# Altium footprint library 示波器.PcbLib: 26 footprints (part 2 of 2)
Each footprint in its own frame and in the unit in brackets; x right, y up, seen from the top. Pads: shape width x height; smd on the part's side, far side on the other; paste and mask are expansions set on the pad; w line width, h text height; cw(c..) or ccw(c..) is an arc to the next point about the centre after c.
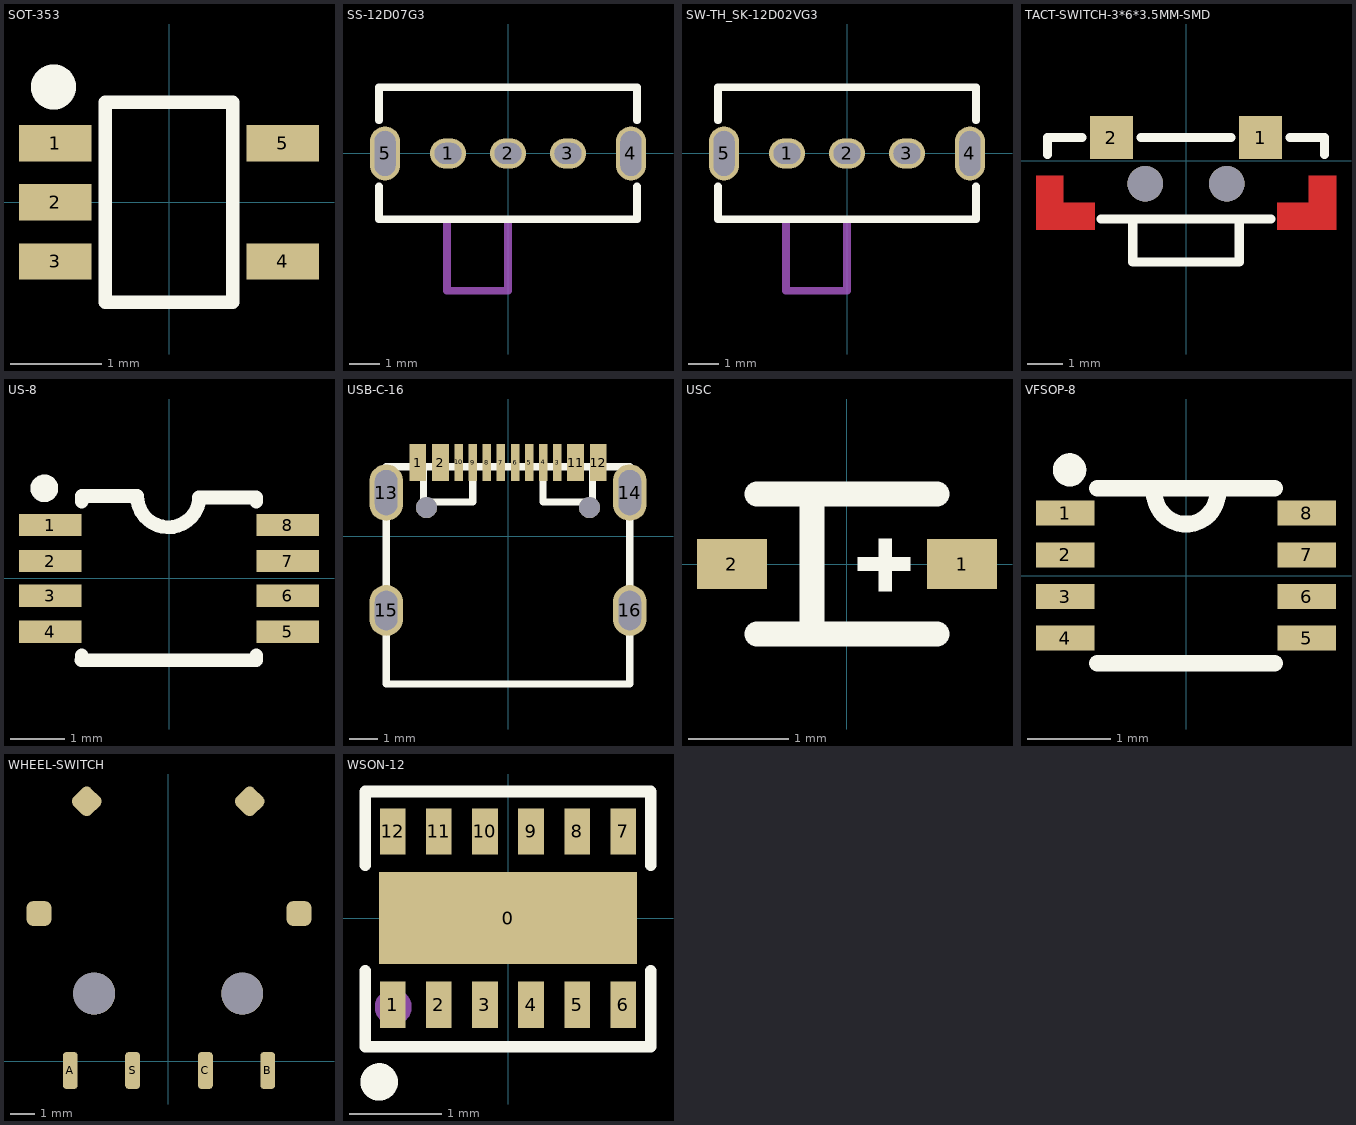
[diagram p1: the footprints below, top view; thin cyan lines are the x and y axes]

## SOT-353 [mm]
pads (5):
  rect 0.8x0.4 smd: 1(-1.25,0.65) 2(-1.25,0) 3(-1.25,-0.65) 4(1.25,-0.65) 5(1.25,0.65)
Top Overlay:
  lines w0.15: -0.7,-1.1 -0.7,1.1 0.7,1.1 0.7,-1.1 -0.7,-1.1
  lines w0.249: -1.394,1.269 ccw(c-1.27,1.27) -1.394,1.271
3D body "User Library-SOT353-1.step": height 1.1, standoff 0, extent -1.2,-1.1 1.2,1.1

## SS-12D07G3 [mm]
pads (5):
  oval 1.2x1 hole 0.7 slot 0.9 at 0 deg: 1(-2,0) 2(0,0) 3(2,0)
  oval 1x1.8 hole 0.7 slot 1.5 at 90 deg: 4(4.1,0) 5(-4.1,0)
Top Overlay:
  lines w0.254: -4.3,-1.103 -4.3,-2.2 4.3,-2.2 4.3,-1.103 ; -4.3,1.103 -4.3,2.2 4.3,2.2 4.3,1.103
Mechanical 15:
  lines w0.254: -2.032,-2.286 -2.032,-4.572 0,-4.572 0,-2.286

## SW-TH_SK-12D02VG3 [mm]
pads (5):
  oval 1.2x1 hole 0.7 slot 0.9 at 0 deg: 1(-2,0) 2(0,0) 3(2,0)
  oval 1x1.8 hole 0.7 slot 1.5 at 90 deg: 4(4.1,0) 5(-4.1,0)
Top Overlay:
  lines w0.254: -4.3,-1.103 -4.3,-2.2 4.3,-2.2 4.3,-1.103 ; -4.3,1.103 -4.3,2.2 4.3,2.2 4.3,1.103
Mechanical 15:
  lines w0.254: -2.032,-2.286 -2.032,-4.572 0,-4.572 0,-2.286

## TACT-SWITCH-3*6*3.5MM-SMD [mm]
pads (4):
  rect 1.2x1.2 smd: 1(2.1,0.65) 2(-2.1,0.65)
  round 1 hole 1 unplated: ""(-1.15,-0.65) ""(1.15,-0.65)
Top Layer:
  region: -4.226,-0.426 -3.464,-0.426 -3.464,-1.188 -2.575,-1.188 -2.575,-1.95 -4.226,-1.95
  region: 4.226,-0.426 3.464,-0.426 3.464,-1.188 2.575,-1.188 2.575,-1.95 4.226,-1.95
Top Overlay:
  lines w0.254: -3.9,0.171 -3.9,0.65 -2.931,0.65 ; -2.4,-1.65 2.4,-1.65 ; -1.5,-1.65 -1.5,-2.85 1.5,-2.85 1.5,-1.65 ; -1.269,0.65 1.269,0.65 ; 2.931,0.65 3.9,0.65 3.9,0.171
Top Paste:
  region: -4.226,-0.426 -3.464,-0.426 -3.464,-1.188 -2.575,-1.188 -2.575,-1.95 -4.226,-1.95
  region: 4.226,-0.426 3.464,-0.426 3.464,-1.188 2.575,-1.188 2.575,-1.95 4.226,-1.95
Top Solder:
  region: -4.226,-0.426 -3.464,-0.426 -3.464,-1.188 -2.575,-1.188 -2.575,-1.95 -4.226,-1.95
  region: 4.226,-0.426 3.464,-0.426 3.464,-1.188 2.575,-1.188 2.575,-1.95 4.226,-1.95
3D body "User Library-E-Switch - TL3330AF130QG (Tact Switch, SMD).step": height 3.5, standoff 0, extent -3.9,-2.838 3.9,0.762

## US-8 [mm]
pads (8):
  rect 1.15x0.406 smd: 1(-2.175,0.978) 2(-2.175,0.318) 3(-2.175,-0.318) 4(-2.175,-0.978) 5(2.175,-0.978) 6(2.175,-0.318) 7(2.175,0.318) 8(2.175,0.978)
Top Overlay:
  circle w0.254: c-2.286,1.651 r0.127
  lines w0.254: -1.603,-1.501 1.595,-1.501 ; -1.6,-1.501 -1.6,-1.412 ; -1.6,1.412 -1.6,1.511 -0.584,1.511 ccw(c-0.013,1.51) 0.559,1.486 ; 0.549,1.486 1.599,1.486 1.599,1.412 ; 1.599,-1.501 1.599,-1.412
3D body "User Library-DGK(S-PDSO-G8).step": height 1.1, standoff 0, extent -2.557,-1.55 2.525,1.55

## USB-C-16 [mm]
pads (18):
  rect 0.6x1.3 smd: 1(-3.2,2.623) 2(-2.4,2.623) 11(2.4,2.623) 12(3.2,2.623)
  rect 0.3x1.3 smd: 3(1.75,2.623) 4(1.25,2.624) 5(0.75,2.623) 6(0.25,2.623) 7(-0.25,2.623) 8(-0.75,2.623) 9(-1.25,2.623) 10(-1.75,2.624)
  oval 1.2x2 hole 0.8 slot 1.6 at 90 deg: 13(-4.32,1.556) 14(4.32,1.556)
  oval 1.2x1.8 hole 0.8 slot 1.4 at 90 deg: 15(-4.32,-2.624) 16(4.32,-2.624)
  round 0.75 hole 0.75 unplated: ""(-2.89,1.026) ""(2.89,1.026)
Top Overlay:
  lines w0.254: -3,2.471 -3,1.221 -1.25,1.221 -1.25,2.471 ; 1.247,2.473 1.247,1.223 2.997,1.223 2.997,2.473 ; -4.32,-5.227 4.32,-5.227 4.32,2.471 -4.32,2.471 -4.32,-5.227
3D body "USB Type C Port (SMD Type).STEP": height 3.26, standoff -0.94, extent -4.47,-5.268 4.47,2.632

## USC [mm]
pads (2):
  rect 0.7x0.5 smd: 1(1.15,0) 2(-1.15,0)
Top Overlay:
  region: 0.635,-0.066 0.108,-0.066 0.108,0.066 0.635,0.066
  region: 0.315,-0.273 0.315,0.254 0.447,0.254 0.447,-0.273
  lines w0.254: -0.9,-0.7 0.9,-0.7 ; -0.9,0.7 0.9,0.7 ; -0.35,-0.7 -0.35,0.7

## VFSOP-8 [mm]
pads (8):
  rect 0.7x0.3 smd: 1(-1.45,0.75) 2(-1.45,0.25) 3(-1.45,-0.25) 4(-1.45,-0.75) 5(1.45,-0.75) 6(1.45,-0.25) 7(1.45,0.25) 8(1.45,0.75)
Top Overlay:
  circle w0.2: c-1.397,1.27 r0.1
  lines w0.2: -1.064,-1.05 0,-1.05 1.064,-1.05 ; -1.064,1.05 1.064,1.05 ; -0.381,1.016 ccw(c0,1) 0.381,1.016
3D body "User Library-TSSOP50P310X90-8N.STEP": height 0.9, standoff 0, extent -1.549,-1.05 1.549,1.05

## WHEEL-SWITCH [mm]
pads (10):
  rrect50% 0.6x1.5 smd paste+0 mask+0.102: A(-3.968,-0.366) B(4.032,-0.366) C(1.507,-0.366) S(-1.443,-0.366)
  rrect50% 1x1 smd paste+0 mask+0.102: ""(-5.236,5.994) ""(5.3,5.994)
  rrect50% 1x1 smd rot 45 paste+0 mask+0.102: ""(-3.302,10.541)
  round 1.7 hole 1.7 unplated: ""(-3,2.75) ""(3,2.75)
  rrect50% 1x1 smd rot 135 paste+0 mask+0.102: ""(3.302,10.541)
3D body "SIQ-02FVS3.stp": height 4.3, standoff -0.2, extent -7.192,-0.254 7.192,14.501

## WSON-12 [mil]
pads (13):
  rect 110.2x39.4 smd: 0(0,0)
  rect 11x19.7 smd: 1(-49.21,-37) 2(-29.53,-37) 3(-9.84,-37) 4(9.84,-37) 5(29.53,-37) 6(49.21,-37) 7(49.21,37) 8(29.53,37) 9(9.84,37) 10(-9.84,37) 11(-29.53,37) 12(-49.21,37)
Top Overlay:
  circle w10: c-55,-70 r3
  lines w5: -61,-22.53 -61,-55 61,-55 61,-22.53 ; -61,22.53 -61,54 61,54 61,22.53
Mechanical 15:
  circle w7.87: c-49,-38 r3.94
3D body "User Library-WFDFN-12.step": height 29.57, standoff -0.39, extent -59.09,-39.41 59.1,39.41